# Altium footprint library Connectors.PcbLib: 104 footprints (part 5 of 7)
Each footprint in its own frame and in the unit in brackets; x right, y up, seen from the top. Pads: shape width x height; smd on the part's side, far side on the other; paste and mask are expansions set on the pad; w line width, h text height; cw(c..) or ccw(c..) is an arc to the next point about the centre after c.
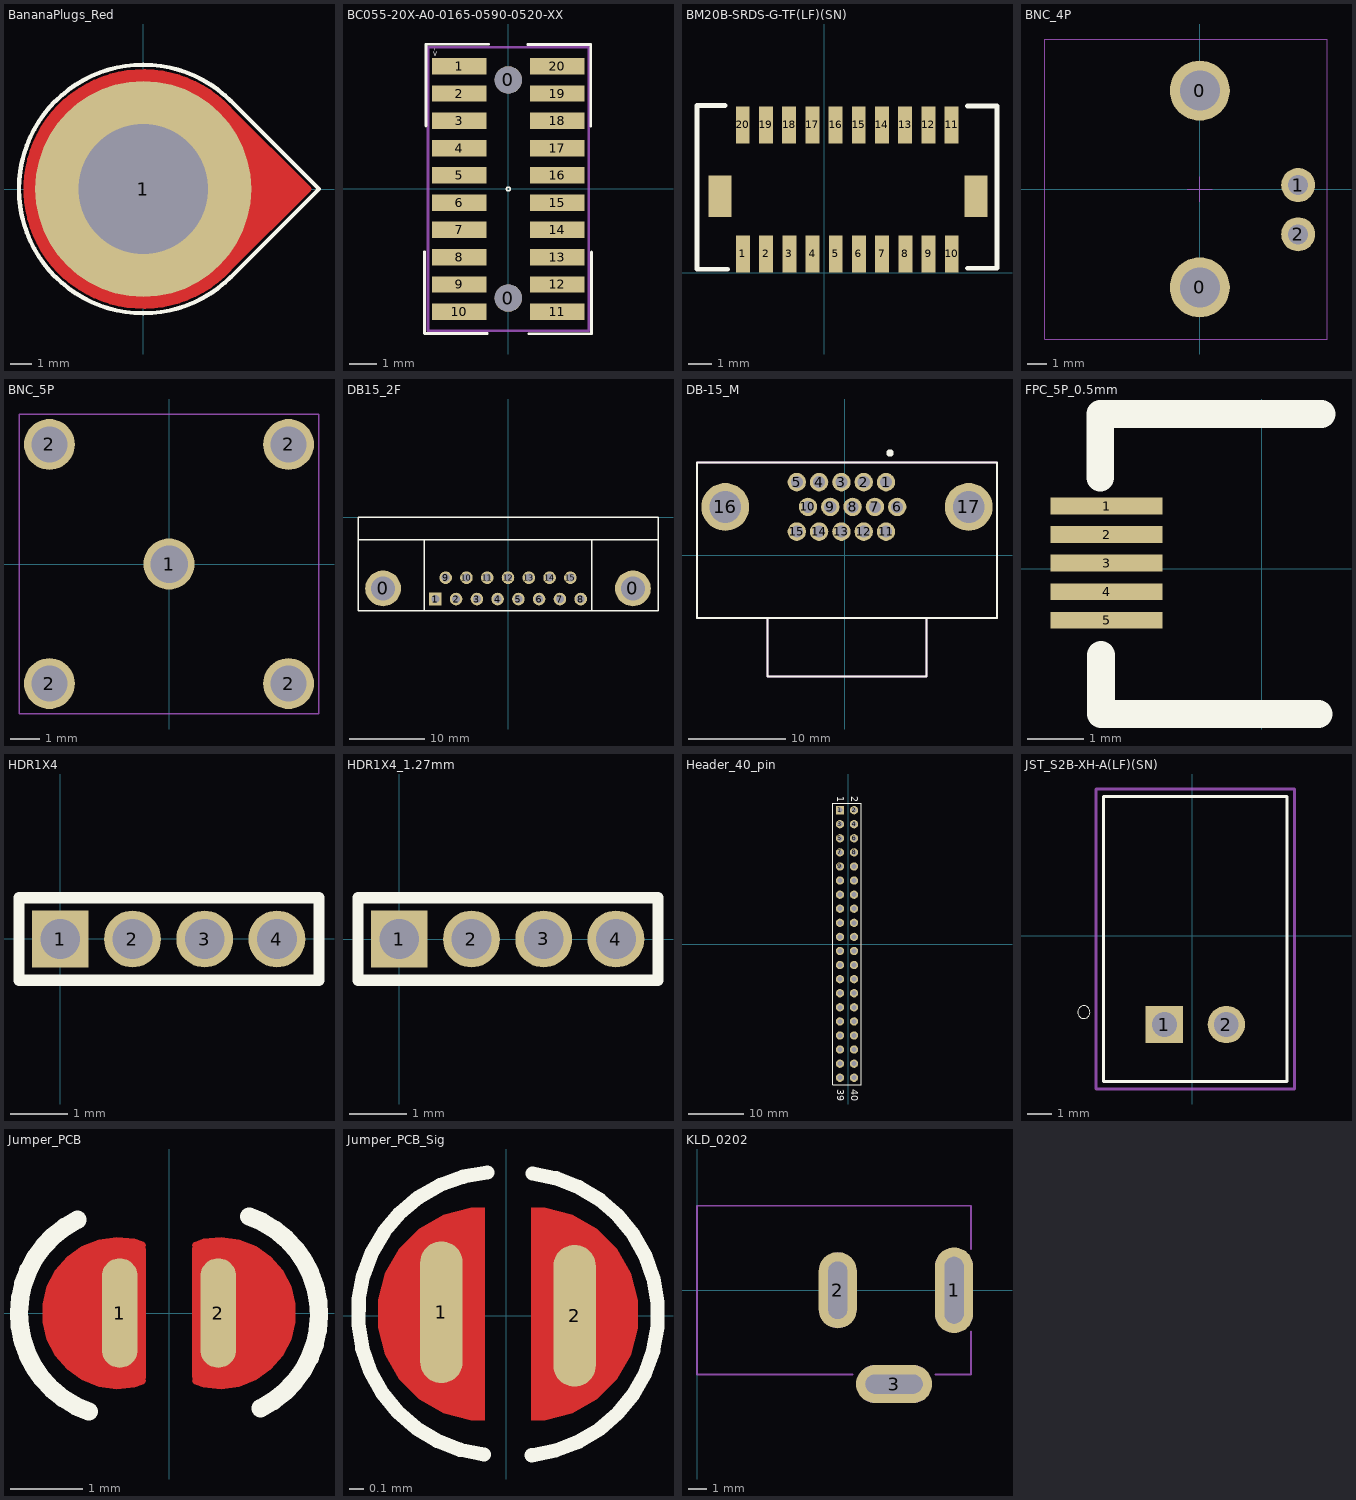
[diagram p4: the footprints below, top view; thin cyan lines are the x and y axes]

## BananaPlugs_Red [mil]
pads (1):
  round 400 hole 240: 1(0,0)
Top Layer:
  region: 158.64,-146.59 148.87,-157.16 126.7,-175.53 102.29,-190.79 76.06,-202.68 48.5,-210.98 20.07,-215.55 -8.71,-216.3 -37.33,-213.24 -65.3,-206.4 -92.11,-195.9 -117.29,-181.95 -140.4,-164.78 -161.02,-144.69 -178.8,-122.04 -193.41,-97.23 -204.61,-70.71 -212.18,-42.93 -216,-14.4 -216,14.4 -212.18,42.93 -204.61,70.71 -193.41,97.23 -178.8,122.04 -161.02,144.69 -140.4,164.78 -117.29,181.95 -92.11,195.9 -65.3,206.4 -37.33,213.24 -8.71,216.3 20.07,215.55 48.5,210.98 76.06,202.68 102.29,190.79 126.7,175.53 148.87,157.16 158.64,146.59 159,146 305,0
  lines w12: 158.64,-146.59 cw(c0,0) 158.64,146.59 ; 159,-146 305,0 159,146
Bottom Layer:
  region: 158.64,-146.59 148.87,-157.16 126.7,-175.53 102.29,-190.79 76.07,-202.68 48.5,-210.98 20.07,-215.55 -8.71,-216.3 -37.33,-213.24 -65.3,-206.4 -92.11,-195.9 -117.29,-181.95 -140.4,-164.78 -161.02,-144.69 -178.8,-122.04 -193.41,-97.23 -204.61,-70.71 -212.18,-42.93 -216,-14.4 -216,14.4 -212.18,42.93 -204.61,70.71 -193.41,97.23 -178.8,122.04 -161.02,144.69 -140.4,164.78 -117.29,181.95 -92.11,195.9 -65.3,206.4 -37.33,213.24 -8.71,216.3 20.07,215.55 48.5,210.98 76.07,202.68 102.29,190.79 126.7,175.53 148.87,157.16 158.64,146.59 159,146 305,0
Top Overlay:
  lines w8: 162.63,-162.63 cw(c0,0) 162.63,162.63 325.27,0 162.63,-162.63
Bottom Overlay:
  lines w8: 162.63,-162.63 cw(c0,0) 162.63,162.63 325.27,0 162.63,-162.63
Top Solder:
  region: 158.64,-146.59 148.87,-157.16 126.7,-175.53 102.29,-190.79 76.07,-202.68 48.5,-210.98 20.07,-215.55 -8.71,-216.3 -37.33,-213.24 -65.3,-206.4 -92.11,-195.9 -117.29,-181.95 -140.4,-164.78 -161.02,-144.69 -178.8,-122.04 -193.41,-97.23 -204.61,-70.71 -212.18,-42.93 -216,-14.4 -216,14.4 -212.18,42.93 -204.61,70.71 -193.41,97.23 -178.8,122.04 -161.02,144.69 -140.4,164.78 -117.29,181.95 -92.11,195.9 -65.3,206.4 -37.33,213.24 -8.71,216.3 20.07,215.55 48.5,210.98 76.07,202.68 102.29,190.79 126.7,175.53 148.87,157.16 158.64,146.59 159,146 305,0
Bottom Solder:
  region: 158.64,-146.59 148.87,-157.16 126.7,-175.53 102.29,-190.79 76.07,-202.68 48.5,-210.98 20.07,-215.55 -8.71,-216.3 -37.33,-213.24 -65.3,-206.4 -92.11,-195.9 -117.29,-181.95 -140.4,-164.78 -161.02,-144.69 -178.8,-122.04 -193.41,-97.23 -204.61,-70.71 -212.18,-42.93 -216,-14.4 -216,14.4 -212.18,42.93 -204.61,70.71 -193.41,97.23 -178.8,122.04 -161.02,144.69 -140.4,164.78 -117.29,181.95 -92.11,195.9 -65.3,206.4 -37.33,213.24 -8.71,216.3 20.07,215.55 48.5,210.98 76.07,202.68 102.29,190.79 126.7,175.53 148.87,157.16 158.64,146.59 159,146 305,0
3D body "User Library-ST-351A V1 - RED.STEP": height 326.77, standoff -303.18, extent -222.45,-222.2 456.69,222.18

## BC055-20X-A0-0165-0590-0520-XX [mm]
pads (22):
  round 1 hole 1: 0(0.001,-4) 0(0.001,4)
  rect 2x0.6 smd: 1(-1.799,4.5) 2(-1.799,3.5) 3(-1.799,2.5) 4(-1.799,1.5) 5(-1.799,0.5) 6(-1.799,-0.5) 7(-1.799,-1.5) 8(-1.799,-2.5) 9(-1.799,-3.5) 10(-1.799,-4.5) 11(1.801,-4.5) 12(1.801,-3.5) 13(1.801,-2.5) 14(1.801,-1.5) 15(1.801,-0.5) 16(1.801,0.5) 17(1.801,1.5) 18(1.801,2.5) 19(1.801,3.5) 20(1.801,4.5)
Top Overlay:
  circle w0.05: c0,0 r0.072
  lines w0.1: -3.073,-2.3 -3.073,-5.3 -0.773,-5.3 ; -3.023,2.309 -3.023,5.309 -0.723,5.309 ; 0.711,5.3 3.011,5.3 ; 0.748,-5.309 3.048,-5.309 3.048,-2.309 ; 3.023,2.3 3.023,5.3
  text "->" at -2.769,5.156 h0.2
Mechanical 3:
  lines w0.1: -2.949,-5.2 2.951,-5.2 2.951,5.2 -2.949,5.2 -2.949,-5.2
3D body "BC055-20X-A0-0165-0590-0520-XX_revE.STEP": height 7.55, standoff 0, extent -2.599,-5.1 2.601,5.1

## BM20B-SRDS-G-TF(LF)(SN) [mm]
pads (22):
  rect 0.6x1.6 smd: 1(-3.505,0.813) 2(-2.505,0.813) 3(-1.505,0.813) 4(-0.505,0.813) 5(0.495,0.813) 6(1.495,0.813) 7(2.495,0.813) 8(3.495,0.813) 9(4.495,0.813) 10(5.495,0.813) 11(5.486,6.375) 12(4.486,6.375) 13(3.486,6.375) 14(2.486,6.375) 15(1.486,6.375) 16(0.486,6.375) 17(-0.514,6.375) 18(-1.514,6.375) 19(-2.514,6.375) 20(-3.514,6.375)
  rect 1x1.8 smd: ""(-4.496,3.302) ""(6.545,3.302)
Top Overlay:
  lines w0.2: -4.267,7.214 -5.486,7.214 -5.486,0.152 -4.166,0.152 ; 6.172,0.203 7.442,0.203 7.442,7.188 6.172,7.188
3D body "BM20B-SRDS-G-TF.STEP": height 4.35, standoff 0, extent -5.159,0.508 7.141,6.908

## BNC_4P [mil]
pads (4):
  round 120 hole 80: 0(0,-196.85) 0(0,196.85)
  round 68 hole 40: 1(196.85,7.87) 2(196.85,-90.55)
Mechanical 13:
  lines w2: -25,0 25,0 ; 0,-25 0,25
Mechanical 14:
  lines w2: -310,-300 -310,300 255,300 255,-300 -310,-300
3D body "User Library-BNC-144.STEP": height 519.2, standoff -161.8, extent -1124.99,-290.5 250.01,290.5

## BNC_5P [mil]
pads (5):
  round 68 hole 50: 1(0,0)
  round 68 hole 48: 2(-159.45,-159.45) 2(-159.45,159.45) 2(159.45,-159.45) 2(159.45,159.45)
Mechanical 14:
  lines w2: -200,-200 200,-200 200,200 -200,200 -200,-200
3D body "User Library-BNC84CT-9000.STEP": height 600.39, standoff -177.17, extent -216.53,-216.53 1043.31,216.54

## DB15_2F [mil]
height 501.97
pads (17):
  round 188 hole 125: 0(-655.91,-374.02) 0(655.91,-374.02)
  rect 66x66 hole 42: 1(-381.69,-429.92)
  round 66 hole 42: 2(-272.64,-429.92) 3(-163.58,-429.92) 4(-54.53,-429.92) 5(54.53,-429.92) 6(163.58,-429.92) 7(272.64,-429.92) 8(381.69,-429.92) 9(-327.17,-318.11) 10(-218.11,-318.11) 11(-109.05,-318.11) 12(0,-318.11) 13(109.06,-318.11) 14(218.11,-318.11) 15(327.17,-318.11)
Top Overlay:
  lines w7.87: -787.4,-118.11 787.4,-118.11 ; -438.58,-492.13 -438.58,-118.11 ; 438.58,-492.13 438.58,-118.11 ; -787.4,-492.13 -787.4,0 787.4,0 787.4,-492.13 -787.4,-492.13
3D body "SW3DPS-DB15RA_F-DEFAULT.STEP": height 494.09, standoff -137.8, extent -779.92,-500 779.92,224.41

## DB15_3F [mm]
height 12.75
3D body "User Library-17EBH-015P.STEP": height 12.55, standoff -3.6, extent -9.817,-56.225 20.993,-34.01
3D body "SW3dPS-SLIM D-SUB RIGHT ANGLE PCB MOUNT.STEP": height 6.25, standoff -7.09, extent 25.113,-52.612 55.913,-39.142

## DB-15_M [mm]
pads (17):
  round 1.89 hole 1.24: 1(4.25,7.501) 2(1.96,7.501) 3(-0.33,7.501) 4(-2.62,7.501) 5(-4.909,7.501) 6(5.395,4.961) 7(3.106,4.961) 8(0.816,4.961) 9(-1.475,4.961) 10(-3.765,4.961) 11(4.25,2.421) 12(1.96,2.421) 13(-0.33,2.421) 14(-2.62,2.421) 15(-4.909,2.421)
  round 4.91 hole 3.26: 16(-12.252,4.961) 17(12.738,4.961)
Top Overlay:
  circle w0.4: c4.667,10.49 r0.174
  lines w0.2: -7.907,-6.469 -7.907,-12.469 8.393,-12.469 8.393,-6.469 ; -15.157,-6.469 -15.157,9.531 15.643,9.531 15.643,-6.469 -15.157,-6.469
Mechanical 15:
  lines w0.2: -7.907,-6.469 -7.907,-12.469 8.393,-12.469 8.393,-6.469 ; -15.157,-6.469 15.643,-6.469 15.643,9.531 -15.157,9.531 -15.157,-6.469

## FPC_5P_0.5mm [mm]
pads (5):
  rect 2x0.3 smd: 1(-2.769,1.123) 2(-2.769,0.614) 3(-2.769,0.104) 4(-2.769,-0.405) 5(-2.769,-0.914)
Top Overlay:
  lines w0.5: -2.883,1.638 -2.883,2.769 1.067,2.769 ; -2.87,-1.537 -2.87,-2.591 1.016,-2.591
3D body "512810594.stp": height 1.15, standoff -0.05, extent -2.609,-2.187 1.441,2.413

## HDR1X4 [mm] "Connector; Header; 4 Position"
pads (4):
  rect 1x1 hole 0.7: 1(0,0)
  round 1 hole 0.7: 2(1.27,0) 3(2.54,0) 4(3.81,0)
Top Overlay:
  lines w0.2: -0.725,-0.725 -0.725,0.725 4.55,0.725 4.55,-0.725 -0.725,-0.725

## HDR1X4_1.27mm [mm] "Connector; Header; 4 Position"
pads (4):
  rect 1x1 hole 0.7: 1(0,0)
  round 1 hole 0.7: 2(1.27,0) 3(2.54,0) 4(3.81,0)
Top Overlay:
  lines w0.2: -0.725,-0.725 -0.725,0.725 4.55,0.725 4.55,-0.725 -0.725,-0.725

## Header_40_pin [mm]
pads (40):
  rect 1.5x1.5 hole 0.9: 1(-1.54,24.22)
  round 1.5 hole 0.9: 2(1,24.22) 3(-1.54,21.68) 4(1,21.68) 5(-1.54,19.14) 6(1,19.14) 7(-1.54,16.6) 8(1,16.6) 9(-1.54,14.06) 10(1,14.06) 11(-1.54,11.52) 12(1,11.52) 13(-1.54,8.98) 14(1,8.98) 15(-1.54,6.44) 16(1,6.44) 17(-1.54,3.9) 18(1,3.9) 19(-1.54,1.36) 20(1,1.36) 21(-1.54,-1.18) 22(1,-1.18) 23(-1.54,-3.72) 24(1,-3.72) 25(-1.54,-6.26) 26(1,-6.26) 27(-1.54,-8.8) 28(1,-8.8) 29(-1.54,-11.34) 30(1,-11.34) 31(-1.54,-13.88) 32(1,-13.88) 33(-1.54,-16.42) 34(1,-16.42) 35(-1.54,-18.96) 36(1,-18.96) 37(-1.54,-21.5) 38(1,-21.5) 39(-1.54,-24.04) 40(1,-24.04)
Top Overlay:
  lines w0.2: -2.81,-25.31 2.27,-25.31 2.27,25.49 -2.81,25.49 -2.81,-25.31
  text "39" at -2.048,-26.072 h1.27
  text "40" at 0.492,-26.072 h1.27
  text "2" at 0.492,26.76 h1.27
  text "1" at -2.048,26.76 h1.27

## JST_S2B-XH-A(LF)(SN) [mm]
pads (2):
  rect 1.508x1.508 hole 1: 1(-1.133,-3.586)
  round 1.508 hole 1: 2(1.367,-3.586)
Top Overlay:
  circle w0: c-4.383,-3.086 r0.254
  lines w0.127: -3.583,-5.886 3.817,-5.886 3.817,5.614 -3.583,5.614 -3.583,-5.886
Mechanical 1:
  lines w0.127: -3.883,-6.186 4.117,-6.186 4.117,5.914 -3.883,5.914 -3.883,-6.186

## Jumper_PCB [mil]
pads (2):
  oval 19.68x60 smd: 1(-27,0) 2(27,0)
Top Layer:
  region: -14.16,-38.97 -18.84,-40.63 -28.71,-41.64 -38.55,-40.29 -47.79,-36.65 -55.9,-30.93 -62.43,-23.44 -67,-14.63 -69.35,-4.98 -69.36,4.94 -67.01,14.59 -62.45,23.41 -55.93,30.9 -47.82,36.63 -38.59,40.28 -28.75,41.64 -18.87,40.64 -14.19,38.98 -13.9,38.88 -13.41,38.51 -13.06,38 -12.87,37.42 -12.87,37.11 -12.87,36.99 -12.9,36.74 -12.97,36.49 -13.06,36.26 -13.12,36.15 -13.06,36.04 -12.97,35.81 -12.9,35.57 -12.87,35.32 -12.87,35.19 -12.87,-35.67 -12.87,-35.76 -12.89,-35.93 -12.92,-36.1 -12.96,-36.26 -12.99,-36.34 -12.95,-36.43 -12.89,-36.62 -12.86,-36.81 -12.84,-37 -12.84,-37.1 -12.84,-37.41 -13.02,-37.99 -13.38,-38.49 -13.87,-38.87
  region: 14.16,38.97 18.84,40.63 28.71,41.64 38.55,40.29 47.79,36.65 55.9,30.93 62.43,23.44 67,14.63 69.35,4.98 69.36,-4.94 67.01,-14.59 62.45,-23.41 55.93,-30.9 47.82,-36.63 38.59,-40.28 28.75,-41.64 18.87,-40.64 14.19,-38.98 13.9,-38.88 13.41,-38.51 13.06,-38 12.87,-37.42 12.87,-37.11 12.87,-36.99 12.9,-36.74 12.97,-36.49 13.06,-36.26 13.12,-36.15 13.06,-36.04 12.97,-35.81 12.9,-35.57 12.87,-35.32 12.87,-35.19 12.87,35.67 12.87,35.76 12.89,35.93 12.92,36.1 12.96,36.26 12.99,36.34 12.95,36.43 12.89,36.62 12.86,36.81 12.84,37 12.84,37.1 12.84,37.41 13.02,37.99 13.38,38.49 13.87,38.87
Top Overlay:
  lines w10: -50.14,51.23 ccw(c-25.17,-0.1) -44.02,-53.99 ; 44.02,52.99 cw(c25.17,-0.9) 50.14,-52.23

## Jumper_PCB_Sig [mm]
pads (2):
  oval 0.3x1 smd: 1(-0.457,0.025) 2(0.483,0)
Top Layer:
  region: -0.152,-0.737 -0.251,-0.737 -0.442,-0.685 -0.613,-0.587 -0.753,-0.447 -0.851,-0.276 -0.902,-0.085 -0.902,0.112 -0.851,0.303 -0.753,0.474 -0.613,0.614 -0.442,0.712 -0.251,0.763 -0.152,0.763
  region: 0.178,0.762 0.277,0.762 0.467,0.711 0.638,0.612 0.778,0.473 0.877,0.301 0.928,0.111 0.928,-0.087 0.877,-0.277 0.778,-0.449 0.638,-0.588 0.467,-0.687 0.277,-0.738 0.178,-0.738
Top Overlay:
  lines w0.1: -0.157,-0.979 cw(c-0.045,0.015) -0.133,1.011 ; 0.18,-0.984 ccw(c0.071,0.01) 0.185,1.004

## KLD_0202 [mil]
pads (3):
  oval 80x180 hole 40 slot 140 at 90 deg: 1(539.37,0)
  oval 80x160 hole 40 slot 120 at 90 deg: 2(295.28,0)
  oval 160x80 hole 40 slot 120 at 0 deg: 3(413.39,-196.85)
Mechanical 2:
  lines w79.37: 295.28,-39.37 295.28,39.37 ; 374.02,-196.85 452.76,-196.85 ; 539.37,-49.21 539.37,49.21
Mechanical 13:
  lines w4: 326.77,-177.17 0,-177.17 0,177.17 574.8,177.17 574.8,86.61 ; 500,-177.17 574.8,-177.17 574.8,-86.61
3D body "User Library-K375A -PCM DC Power Jack 2mm Pin.STEP": height 433.07, standoff -200.79, extent -9.25,-212.75 561.62,173.07